# Altium footprint library mPCIe_Breakout01_BRD1.PcbLib: 41 footprints (part 1 of 3)
Each footprint in its own frame and in the unit in brackets; x right, y up, seen from the top. Pads: shape width x height; smd on the part's side, far side on the other; paste and mask are expansions set on the pad; w line width, h text height; cw(c..) or ccw(c..) is an arc to the next point about the centre after c.
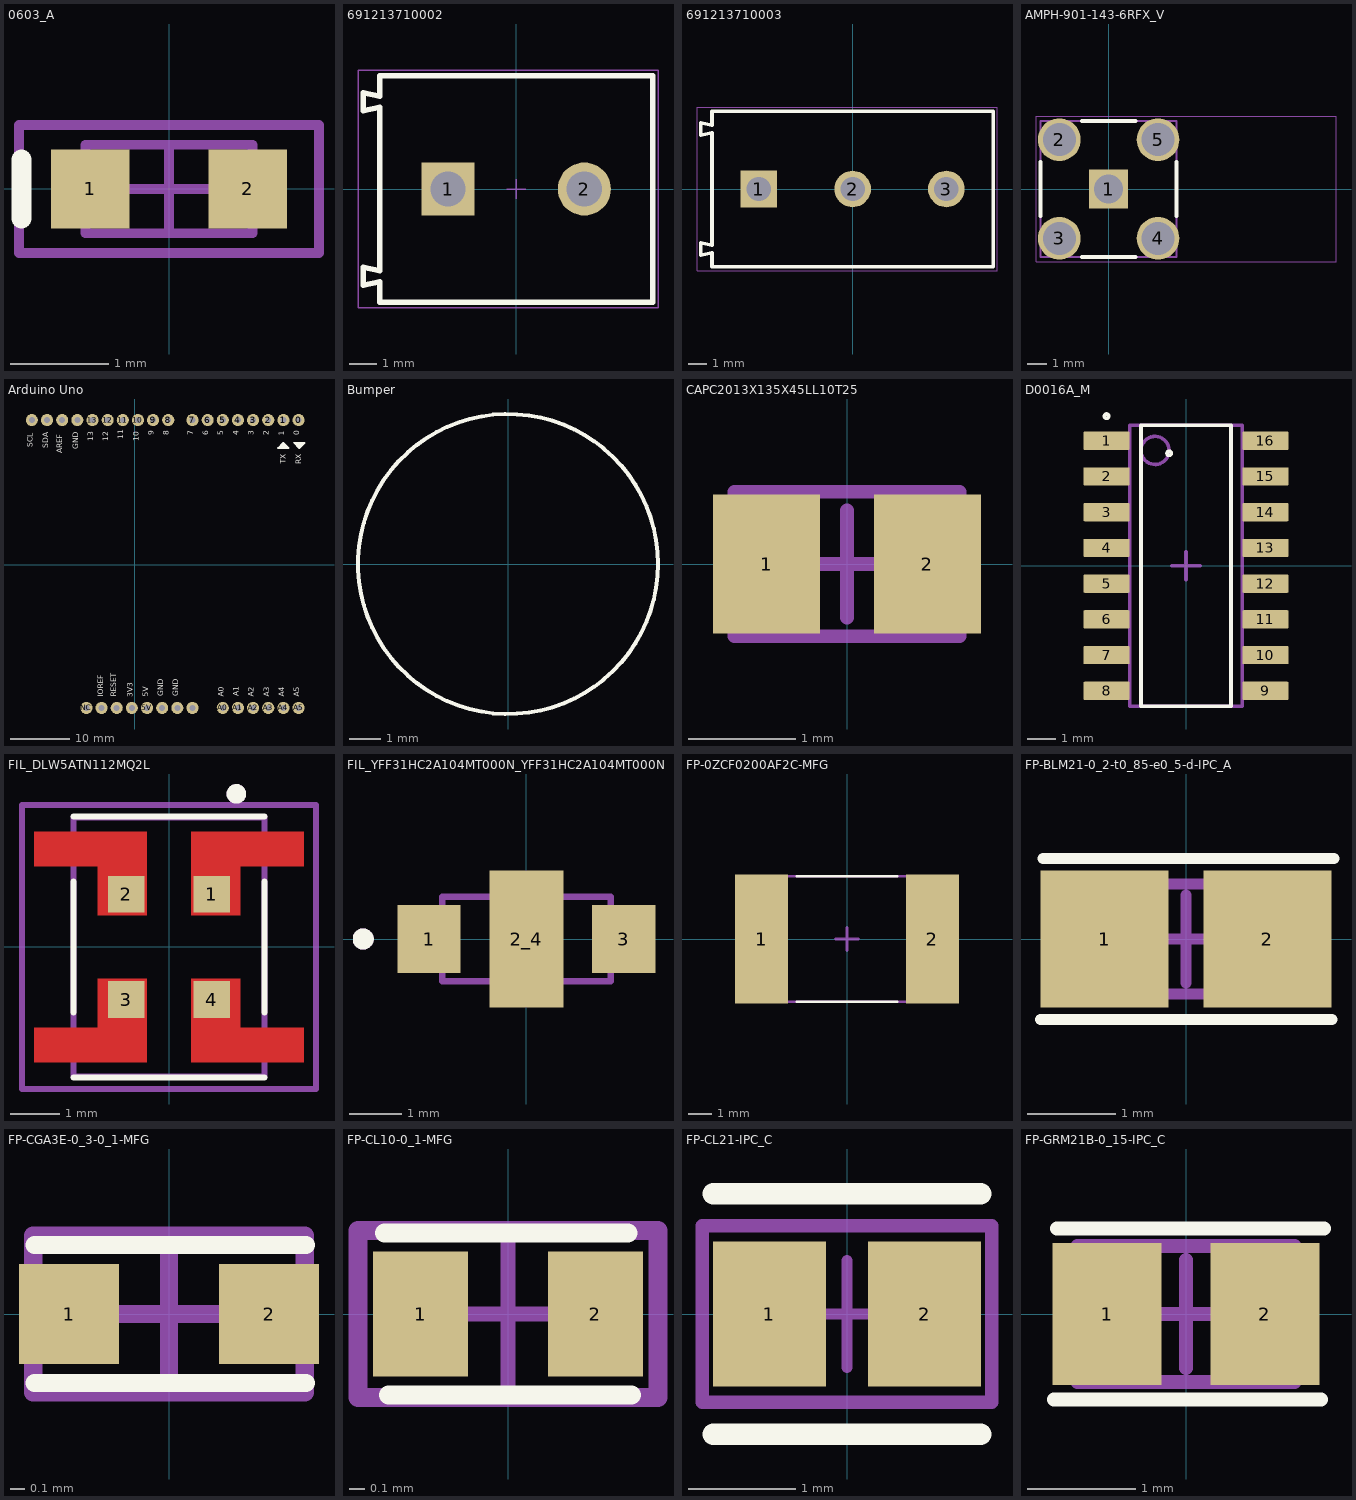
[diagram p0: the footprints below, top view; thin cyan lines are the x and y axes]

## 0603_A [mm] "Chip LED, 2-Leads, Body 1.6x0.8mm, IPC Medium Density"
height 0.68
pads (2):
  rect 0.8x0.8 smd: 1(-0.8,0) 2(0.8,0)
Top Overlay:
  lines w0.2: -1.5,-0.3 -1.5,0.3
Assembly Top:
  lines w0.1: -0.45,0 0.45,0 ; 0,-0.45 0,0.45 ; -1.525,-0.65 -1.525,0.65 1.525,0.65 1.525,-0.65 -1.525,-0.65
  text ".Designator" at -4.318,1.175 h1.52
3D Models:
  lines w0.1: -0.85,-0.45 -0.85,0.45 0.85,0.45 0.85,-0.45 -0.85,-0.45
3D body "WL-SMCW_0603_LED.stp": height 0.7, standoff 0, extent -0.8,-0.4 0.8,0.4

## 691213710002 [mm] "5,00mm - modular - green - Horizontal entry with rising cage clamp -  10,0mm height - 02p"
height 10
pads (2):
  rect 1.95x1.95 hole 1.3: 1(-2.5,0)
  round 1.95 hole 1.3: 2(2.5,0)
Top Overlay:
  lines w0.2: -5.6,-3.525 -5.6,-2.875 -5,-3 -5,3 -5.6,2.875 -5.6,3.525 -5,3.4 -5,4.15 5,4.15 5,-4.15 -5,-4.15 -5,-3.4 -5.6,-3.525
Assembly Top:
  lines w0.05: -0.35,0 0.35,0 ; 0,-0.35 0,0.35 ; -5.8,-4.35 5.2,-4.35 5.2,4.35 -5.8,4.35 -5.8,-4.35
  lines w0.1: -5.6,-3.525 -5,-3.4 -5,-4.15 5,-4.15 5,4.15 -5,4.15 -5,3.4 -5.6,3.525 -5.6,2.875 -5,3 -5,-3 -5.6,-2.875 -5.6,-3.525
  text ".Designator" at -5.842,4.858 h1.52
3D body "691213710002.stp": height 10.05, standoff -3.75, extent -5.6,-4.15 5,4.15

## 691213710003 [mm] "5,00mm - modular - green - Horizontal entry with rising cage clamp -  10,0mm height - 03p"
height 10
pads (3):
  rect 1.95x1.95 hole 1.3: 1(-5,0)
  round 1.95 hole 1.3: 2(0,0) 3(5,0)
Top Overlay:
  lines w0.2: -8.1,-3.525 -8.1,-2.875 -7.5,-3 -7.5,3 -8.1,2.875 -8.1,3.525 -7.5,3.4 -7.5,4.15 7.5,4.15 7.5,-4.15 -7.5,-4.15 -7.5,-3.4 -8.1,-3.525
Assembly Top:
  lines w0.05: -0.35,0 0.35,0 ; 0,-0.35 0,0.35 ; -8.3,-4.35 7.7,-4.35 7.7,4.35 -8.3,4.35 -8.3,-4.35
  lines w0.1: -8.1,-3.525 -7.5,-3.4 -7.5,-4.15 7.5,-4.15 7.5,4.15 -7.5,4.15 -7.5,3.4 -8.1,3.525 -8.1,2.875 -7.5,3 -7.5,-3 -8.1,-2.875 -8.1,-3.525
  text ".Designator" at -4.674,5.467 h1.52
3D body "691213710003.stp": height 10.05, standoff -3.75, extent -8.1,-4.15 7.5,4.15

## AMPH-901-143-6RFX_V [mm] "THD, 5-Leads, Body 7x7mm, Pitch 2.54mm"
height 9.86
pads (5):
  rect 2x2 hole 1.5: 1(0,0)
  round 2.2 hole 1.7: 2(-2.54,2.54) 3(-2.54,-2.54) 4(2.54,-2.54) 5(2.54,2.54)
Top Overlay:
  lines w0.2: -3.5,-1.38 -3.5,1.38 ; -1.38,-3.5 1.38,-3.5 ; -1.38,3.5 1.38,3.5 ; 3.5,-1.38 3.5,1.38
Assembly Top:
  lines w0.05: -3.74,-3.74 -3.74,3.74 11.7,3.74 11.7,-3.74 -3.74,-3.74
  text ".Designator" at -2.769,4.578 h1.52
3D Models:
  lines w0.1: -3.5,-3.5 3.5,-3.5 3.5,3.5 -3.5,3.5 -3.5,-3.5
3D body "901-143-6RFX.stp": height 9.9, standoff -3.9, extent -3.5,-3.5 11.6,3.5

## Arduino Uno [mm]
pads (32):
  round 2.032 / inner round 2.3 / far side round 2.3 hole 1: 0(27.44,24.26) 1(24.9,24.26) 2(22.36,24.26) 3(19.82,24.26) 3.3V(-0.5,-24) 4(17.28,24.26) 5(14.74,24.26) 5V(2.04,-24) 6(12.2,24.26) 7(9.66,24.26) 8(5.596,24.26) 9(3.056,24.26) 10(0.516,24.26) 11(-2.024,24.26) 12(-4.564,24.26) 13(-7.104,24.26) A0(14.74,-24) A1(17.28,-24) A2(19.82,-24) A3(22.36,-24) A4(24.9,-24) A5(27.44,-24) AREF(-12.184,24.26) GND1(7.12,-24) GND2(4.58,-24) GND3(-9.644,24.26) IOREF(-5.58,-24) NC(-8.12,-24) RST(-3.04,-24) SCL(-17.264,24.26) SDA(-14.724,24.26) Vin(9.66,-24)
Top Overlay:
  lines w0.305: 24.392,19.688 24.9,20.196 25.408,19.688 24.646,19.688 25.027,19.942 ; 27.059,20.323 28.075,20.323 27.567,19.815 27.186,20.196 27.694,20.196 ; 27.567,19.942 27.567,20.069 ; 24.011,19.561 24.9,20.45 25.789,19.561 24.011,19.561 ; 26.678,20.45 27.567,19.561 28.456,20.45 26.678,20.45
  text "SDA" at -14.224,19.558 h1.52
  text "0" at 27.887,21.676 h1.52
  text "1" at 25.381,21.665 h1.52
  text "2" at 22.807,21.676 h1.52
  text "3" at 20.267,21.676 h1.52
  text "4" at 17.727,21.676 h1.52
  text "5" at 15.187,21.676 h1.52
  text "6" at 12.647,21.676 h1.52
  text "7" at 10.107,21.676 h1.52
  text "10" at 0.963,20.669 h1.52
  text "11" at -1.577,21.072 h1.52
  text "12" at -4.117,20.669 h1.52
  text "13" at -6.657,20.669 h1.52
  text "RX" at 28.202,16.894 h1.52
  text "TX" at 25.662,16.919 h1.52
  text "GND" at -9.172,19.386 h1.52
  text "AREF" at -11.811,18.669 h1.52
  text "SCL" at -16.764,19.685 h1.52
  text "8" at 6.043,21.676 h1.52
  text "9" at 3.503,21.676 h1.52
  text "A5" at 27.911,-22.142 h1.52
  text "A4" at 25.379,-22.136 h1.52
  text "A3" at 22.832,-22.138 h1.52
  text "A2" at 20.301,-22.133 h1.52
  text "A1" at 17.761,-22.044 h1.52
  text "A0" at 15.213,-22.136 h1.52
  text "GND" at 7.599,-22.013 h1.52
  text "GND" at 5.059,-22.013 h1.52
  text "5V" at 2.54,-22.098 h1.52
  text "3V3" at 0.008,-22.222 h1.52
  text "RESET" at -2.786,-22.095 h1.52
  text "IOREF" at -4.945,-22.095 h1.52
Assembly Top:
  text ".Designator" at -18.567,27.006 h1.52

## Bumper [mm]
Top Overlay:
  circle w0.127: c0,0 r4.763
Assembly Top:
  text ".Designator" at -4.826,5.239 h1.52
3D body "Bumper v1.step": height 4.84, standoff 0.01, extent -4.763,-4.759 4.763,4.759

## CAPC2013X135X45LL10T25 [mm] "Chip Capacitor, 2-Leads, Body 2.00x1.25mm, IPC High Density"
height 1.35
pads (2):
  rect 1x1.3 smd: 1(-0.75,0) 2(0.75,0)
Assembly Top:
  lines w0.127: -0.5,0 0.5,0 ; 0,-0.5 0,0.5 ; -1.05,-0.675 -1.05,0.675 1.05,0.675 1.05,-0.675 -1.05,-0.675
  text ".Designator" at -3.581,1.302 h1.52
3D body: height 1.35, standoff 0, extent -0.6,-0.675 0.6,0.675
3D body: height 1.35, standoff 0, extent -1.05,-0.675 -0.6,0.675
3D body: height 1.35, standoff 0, extent 0.6,-0.675 1.05,0.675

## D0016A_M [mm] "SOIC, 16-Leads, Body 10x4mm, Pitch 1.27mm, IPC Low Density"
height 1.75
pads (16):
  rrect15% 1.65x0.65 smd: 1(-2.825,4.445) 2(-2.825,3.175) 3(-2.825,1.905) 4(-2.825,0.635) 5(-2.825,-0.635) 6(-2.825,-1.905) 7(-2.825,-3.175) 8(-2.825,-4.445) 9(2.825,-4.445) 10(2.825,-3.175) 11(2.825,-1.905) 12(2.825,-0.635) 13(2.825,0.635) 14(2.825,1.905) 15(2.825,3.175) 16(2.825,4.445)
Top Overlay:
  circle w0.127: c-2.825,5.32 r0.076
  circle w0.127: c-0.6,4 r0.076
  lines w0.127: -1.6,-5 -1.6,5 1.6,5 1.6,-5 -1.6,-5
Assembly Top:
  circle w0.127: c-1.1,4.1 r0.5
  lines w0.127: -0.5,0 0.5,0 ; 0,-0.5 0,0.5 ; -2,-5 2,-5 2,5 -2,5 -2,-5
  text ".Designator" at -1.575,-0.35 h1.52
3D body "SOIC-16akaD0016AakaM16A.stp": height 1.59, standoff -0.01, extent -2.997,-4.953 2.997,4.953

## FIL_DLW5ATN112MQ2L [mm]
pads (4):
  rect 0.75x0.75 smd: 1(0.875,1.075) 2(-0.875,1.075) 3(-0.875,-1.075) 4(0.875,-1.075)
Top Layer:
  region: -0.45,2.35 -2.75,2.35 -2.75,1.65 -1.45,1.65 -1.45,0.65 -0.45,0.65
  region: 0.45,-2.35 2.75,-2.35 2.75,-1.65 1.45,-1.65 1.45,-0.65 0.45,-0.65
  region: 0.45,2.35 2.75,2.35 2.75,1.65 1.45,1.65 1.45,0.65 0.45,0.65
  region: -0.45,-2.35 -2.75,-2.35 -2.75,-1.65 -1.45,-1.65 -1.45,-0.65 -0.45,-0.65
Top Overlay:
  circle w0.2: c1.375,3.125 r0.1
  lines w0.127: -1.95,-2.663 1.95,-2.663 ; -1.95,-1.336 -1.95,1.336 ; -1.95,2.663 1.95,2.663 ; 1.95,-1.336 1.95,1.336
Top Paste:
  region: -0.45,2.35 -2.75,2.35 -2.75,1.65 -1.45,1.65 -1.45,0.65 -0.45,0.65
  region: 0.45,-2.35 2.75,-2.35 2.75,-1.65 1.45,-1.65 1.45,-0.65 0.45,-0.65
  region: 0.45,2.35 2.75,2.35 2.75,1.65 1.45,1.65 1.45,0.65 0.45,0.65
  region: -0.45,-2.35 -2.75,-2.35 -2.75,-1.65 -1.45,-1.65 -1.45,-0.65 -0.45,-0.65
Top Solder:
  region: -0.35,2.45 -2.85,2.45 -2.85,1.55 -1.55,1.55 -1.55,0.55 -0.35,0.55
  region: 0.35,-2.45 2.85,-2.45 2.85,-1.55 1.55,-1.55 1.55,-0.55 0.35,-0.55
  region: 0.35,2.45 2.85,2.45 2.85,1.55 1.55,1.55 1.55,0.55 0.35,0.55
  region: -0.35,-2.45 -2.85,-2.45 -2.85,-1.55 -1.55,-1.55 -1.55,-0.55 -0.35,-0.55
Assembly Top:
  circle w0.2: c1.375,3.125 r0.1
  circle w0.2: c1.375,3.125 r0.1
  lines w0.127: -1.95,-2.65 1.95,-2.65 ; -1.95,-2.65 -1.95,2.65 ; -1.95,-2.65 1.95,-2.65 ; -1.95,-2.65 -1.95,2.65 ; -1.95,2.65 1.95,2.65 ; -1.95,2.65 1.95,2.65 ; 1.95,-2.65 1.95,2.65 ; 1.95,-2.65 1.95,2.65 ; -3,-2.9 3,-2.9 3,2.9 -3,2.9 -3,-2.9
  text ".Designator" at -2.819,3.511 h1.52
3D body "DLW5ATN112MQ2L--3DModel-STEP-1.STEP": height 2.35, standoff 0, extent -1.8,-2.5 1.8,2.5

## FIL_YFF31HC2A104MT000N_YFF31HC2A104MT000N [mm]
pads (3):
  rect 1.2x1.3 smd: 1(-1.85,0) 3(1.85,0)
  rect 1.4x2.6 smd paste-0.762: 2_4(0,0)
Top Overlay:
  circle w0.2: c-3.1,0 r0.1
Top Paste:
  region: -0.7,1.3 0.7,1.3 0.7,0.4 -0.7,0.4
  region: -0.7,-0.4 0.7,-0.4 0.7,-1.3 -0.7,-1.3
Top Solder:
  region: -0.7,-0.4 0.7,-0.4 0.7,-1.3 -0.7,-1.3
  region: -0.7,1.3 0.7,1.3 0.7,0.4 -0.7,0.4
  region: 1.25,0.65 2.45,0.65 2.45,-0.65 1.25,-0.65
  region: -2.45,0.65 -1.25,0.65 -1.25,-0.65 -2.45,-0.65
Assembly Top:
  circle w0.2: c-3.1,0 r0.1
  circle w0.2: c-3.1,0 r0.1
  lines w0.127: -1.6,-0.8 1.6,-0.8 ; -1.6,-0.8 -1.6,0.8 ; -1.6,-0.8 1.6,-0.8 ; -1.6,-0.8 -1.6,0.8 ; -1.6,0.8 1.6,0.8 ; -1.6,0.8 1.6,0.8 ; 1.6,-0.8 1.6,0.8 ; 1.6,-0.8 1.6,0.8
  text ".Designator" at -3.124,1.81 h1.52
3D body "YFF31HC2A104MT000N--3DModel-STEP-56544.STEP": height 1.5, standoff 0, extent -1.6,-0.8 1.6,0.8

## FP-0ZCF0200AF2C-MFG [mm]
pads (2):
  rect 2.3x5.6 smd paste+0 mask+0: 1(-3.7,0) 2(3.7,0)
Top Overlay:
  lines w0.127: -2.175,-2.72 2.175,-2.72 ; -2.175,2.72 2.175,2.72
Assembly Top:
  lines w0.127: -0.5,0 0.5,0 ; 0,-0.5 0,0.5 ; -3.99,-2.72 3.99,-2.72 3.99,2.72 -3.99,2.72 -3.99,-2.72
3D Body Bottom:
  text ".Designator" at 0,0.097 h1.52
3D body "0ZCF0200AF2C.STEP": height 1.71, standoff 0.01, extent -3.678,-2.56 3.678,2.56

## FP-BLM21-0_2-t0_85-e0_5-d-IPC_A [mm]
pads (2):
  rect 1.455x1.556 smd paste+0 mask+0: 1(-0.926,0) 2(0.926,0)
Top Overlay:
  lines w0.127: -1.651,-0.914 1.655,-0.914 ; -1.626,0.914 1.681,0.914
Assembly Top:
  lines w0.127: -0.5,0 0.5,0 ; 0,-0.5 0,0.5 ; -1,-0.625 1,-0.625 1,0.625 -1,0.625 -1,-0.625
  text ".Designator" at 0,0.286 h1.52
3D body "FBead_Murata_BLM21PG600SZ1J_eec.STEP": height 1.05, standoff 0, extent -1,-0.625 1,0.625

## FP-CGA3E-0_3-0_1-MFG [mm]
pads (2):
  rect 0.7x0.7 smd paste+0 mask+0: 1(-0.7,0) 2(0.7,0)
Top Overlay:
  lines w0.127: -0.94,-0.483 0.96,-0.483 ; -0.94,0.483 0.96,0.483
Assembly Top:
  lines w0.127: -0.5,0 0.5,0 ; 0,-0.5 0,0.5 ; -0.95,-0.55 0.95,-0.55 0.95,0.55 -0.95,0.55 -0.95,-0.55
  text ".Designator" at 0,-0.166 h1
3D body "Cap_TDK_CGA3E3X7R1E334K080AB_eec.STEP": height 1.1, standoff 0, extent -0.8,-0.4 0.8,0.4

## FP-CL10-0_1-MFG [mm]
pads (2):
  rect 0.625x0.825 smd paste+0 mask+0: 1(-0.575,0) 2(0.575,0)
Top Overlay:
  lines w0.127: -0.813,0.533 0.787,0.533 ; -0.787,-0.533 0.813,-0.533
Assembly Top:
  lines w0.1: -0.5,0 0.5,0 ; 0,-0.5 0,0.5
  lines w0.127: -0.988,-0.55 -0.988,0.55 ; -0.988,-0.55 0.988,-0.55 ; -0.988,-0.55 -0.988,0.55 ; -0.988,-0.55 0.988,-0.55 ; -0.988,0.55 0.988,0.55 ; -0.988,0.55 0.988,0.55 ; 0.988,-0.55 0.988,0.55 ; 0.988,-0.55 0.988,0.55
  text ".Designator" at -1.016,1.175 h1.52
3D body "Cap_Samsung_Electro-Mechanics_America_Inc_CL10B104JB8NNNC_eec.STEP": height 0.9, standoff 0, extent -0.8,-0.4 0.8,0.4

## FP-CL21-IPC_C [mm]
pads (2):
  rect 1.055x1.356 smd paste+0 mask+0: 1(-0.726,0) 2(0.726,0)
Top Overlay:
  lines w0.2: -1.253,-1.125 1.253,-1.125 ; -1.253,1.125 1.253,1.125
Assembly Top:
  lines w0.1: -0.5,0 0.5,0 ; 0,-0.5 0,0.5
  lines w0.127: -1.353,-0.825 -1.353,0.825 1.353,0.825 1.353,-0.825 -1.353,-0.825
  text ".Designator" at -1.27,1.556 h1.52
3D body "Cap_Samsung_CL21B273KBANNNC_eec.STEP": height 1.45, standoff 0, extent -1,-0.625 1,0.625

## FP-GRM21B-0_15-IPC_C [mm]
pads (2):
  rect 1.006x1.308 smd paste+0 mask+0: 1(-0.726,0) 2(0.726,0)
Top Overlay:
  lines w0.127: -1.214,-0.787 1.245,-0.787 ; -1.188,0.787 1.27,0.787
Assembly Top:
  lines w0.127: -0.5,0 0.5,0 ; 0,-0.5 0,0.5 ; -1,-0.625 -1,0.625 1,0.625 1,-0.625 -1,-0.625
  text ".Designator" at 0,-0.253 h1.52
3D body "Cap_Murata_GRM21BC81C106KA73L_eec.STEP": height 1.4, standoff 0, extent -1,-0.625 1,0.625